# Altium footprint library PERCRO_footprints.PcbLib: 177 footprints (part 8 of 12)
Each footprint in its own frame and in the unit in brackets; x right, y up, seen from the top. Pads: shape width x height; smd on the part's side, far side on the other; paste and mask are expansions set on the pad; w line width, h text height; cw(c..) or ccw(c..) is an arc to the next point about the centre after c.
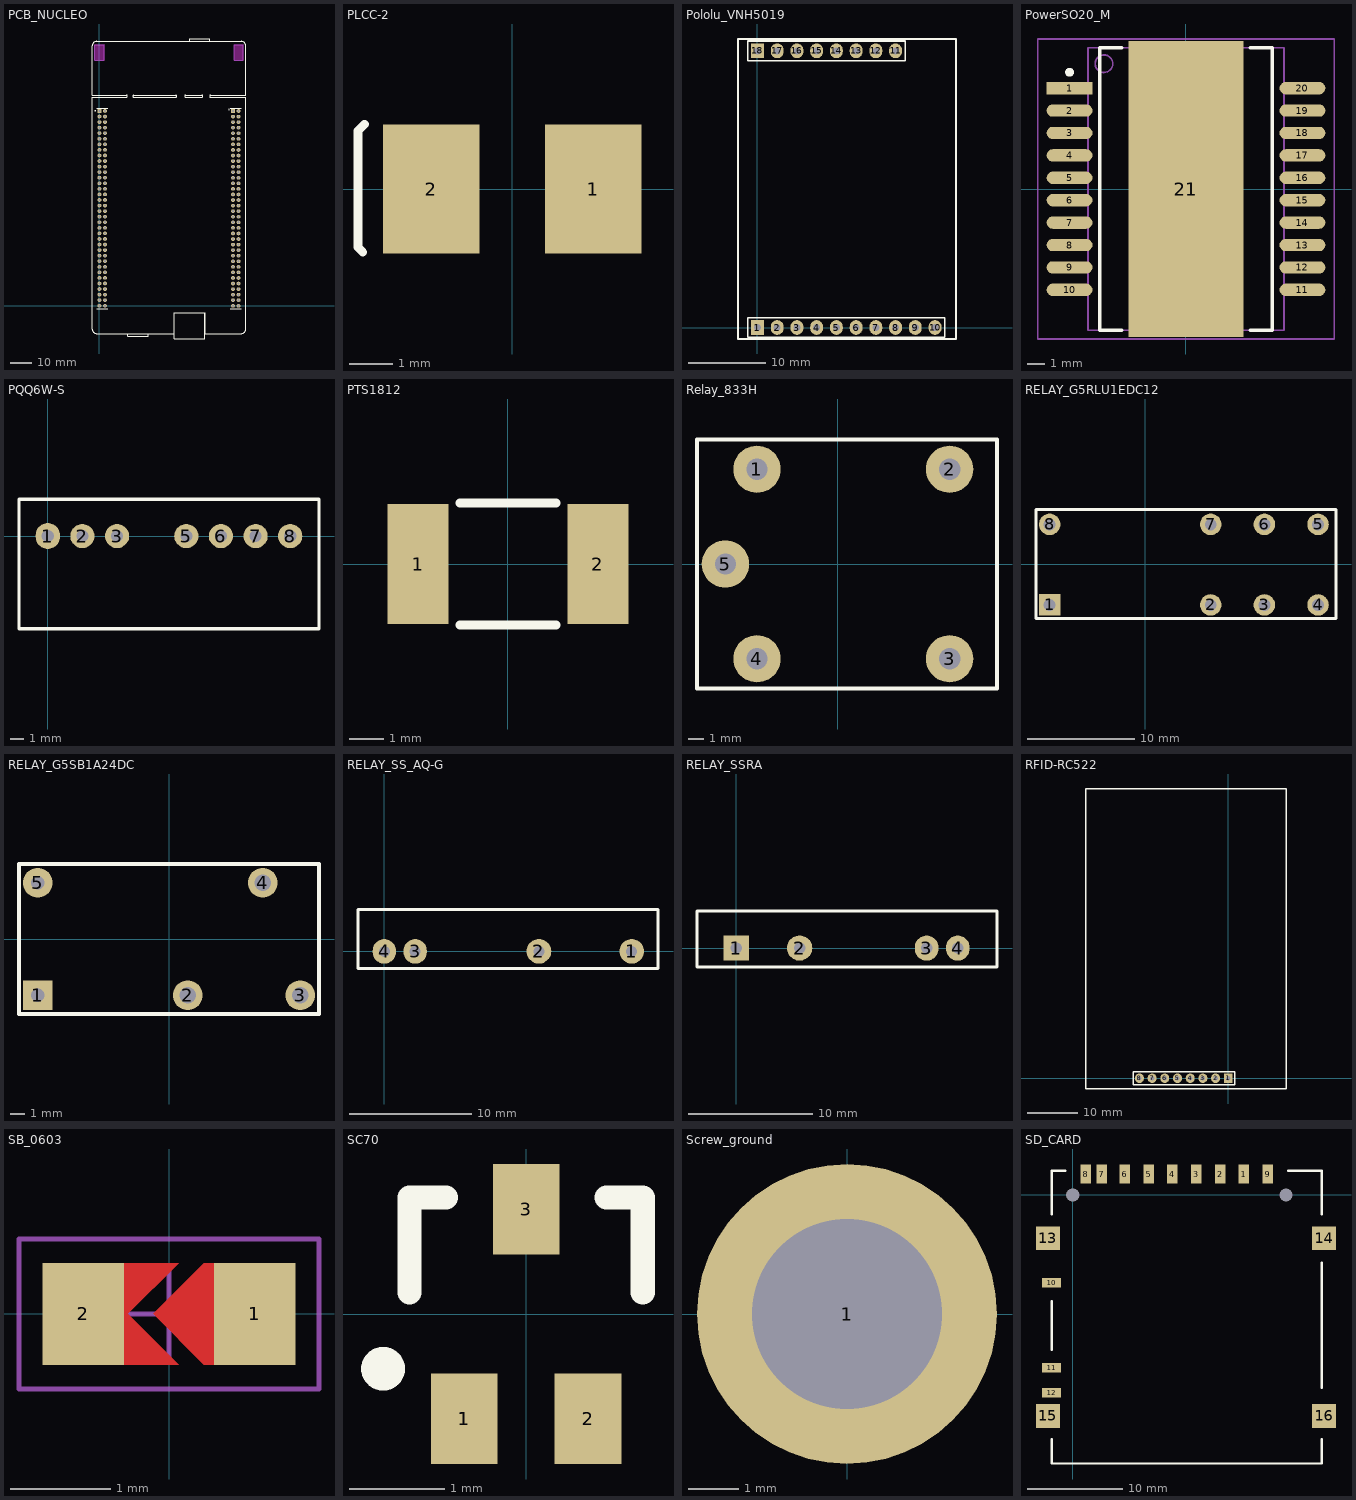
[diagram p7: the footprints below, top view; thin cyan lines are the x and y axes]

## PCB_NUCLEO [mil]
pads (144):
  rect 70x65 hole 40.16: 1(0,3500) 73(2400,3499)
  oval 70x65 hole 40.16: 2(100,3500) 3(0,3400) 4(100,3400) 5(0,3300) 6(100,3300) 7(0,3200) 8(100,3200) 9(0,3100) 10(100,3100) 11(0,3000) 12(100,3000) 13(0,2900) 14(100,2900) 15(0,2800) 16(100,2800) 17(0,2700) 18(100,2700) 19(0,2600) 20(100,2600) 21(0,2500) 22(100,2500) 23(0,2400) 24(100,2400) 25(0,2300) 26(100,2300) 27(0,2200) 28(100,2200) 29(0,2100) 30(100,2100) 31(0,2000) 32(100,2000) 33(0,1900) 34(100,1900) 35(0,1800) 36(100,1800) 37(0,1700) 38(100,1700) 39(0,1600) 40(100,1600) 41(0,1500) 42(100,1500) 43(0,1400) 44(100,1400) 45(0,1300) 46(100,1300) 47(0,1200) 48(100,1200) 49(0,1100) 50(100,1100) 51(0,1000) 52(100,1000) 53(0,900) 54(100,900) 55(0,800) 56(100,800) 57(0,700) 58(100,700) 59(0,600) 60(100,600) 61(0,500) 62(100,500) 63(0,400) 64(100,400) 65(0,300) 66(100,300) 67(0,200) 68(100,200) 69(0,100) 70(100,100) 71(0,0) 72(100,0) 74(2500,3499) 75(2400,3399) 76(2500,3399) 77(2400,3299) 78(2500,3299) 79(2400,3199) 80(2500,3199) 81(2400,3099) 82(2500,3099) 83(2400,2999) 84(2500,2999) 85(2400,2899) 86(2500,2899) 87(2400,2799) 88(2500,2799) 89(2400,2699) 90(2500,2699) 91(2400,2599) 92(2500,2599) 93(2400,2499) 94(2500,2499) 95(2400,2399) 96(2500,2399) 97(2400,2299) 98(2500,2299) 99(2400,2199) 100(2500,2199) 101(2400,2099) 102(2500,2099) 103(2400,1999) 104(2500,1999) 105(2400,1899) 106(2500,1899) 107(2400,1799) 108(2500,1799) 109(2400,1699) 110(2500,1699) 111(2400,1599) 112(2500,1599) 113(2400,1499) 114(2500,1499) 115(2400,1399) 116(2500,1399) 117(2400,1299) 118(2500,1299) 119(2400,1199) 120(2500,1199) 121(2400,1099) 122(2500,1099) 123(2400,999) 124(2500,999) 125(2400,899) 126(2500,899) 127(2400,799) 128(2500,799) 129(2400,699) 130(2500,699) 131(2400,599) 132(2500,599) 133(2400,499) 134(2500,499) 135(2400,399) 136(2500,399) 137(2400,299) 138(2500,299) 139(2400,199) 140(2500,199) 141(2400,99) 142(2500,99) 143(2400,-1) 144(2500,-1)
Top Overlay:
  circle w10: c-75,3502.31 r5
  circle w10: c2328.69,3528 r5
  lines w10: -50,-50 150,-50 ; -50,3550 150,3550 ; -49.37,-500.04 1340,-500.04 1340,-125.16 1898,-125.16 1898,-500.04 2549.06,-500.04 ; -49.21,-500 cw(c-49.21,-421.26) -127.95,-421.26 -127.95,3745.67 482.28,3745.67 ccw(c482.28,3765.35) 482.28,3785.04 -127.95,3785.04 -127.95,4670.87 cw(c-49.21,4670.87) -49.21,4749.61 2549.21,4749.61 cw(c2549.21,4670.87) 2627.95,4670.87 ; 510.9,-499.89 510.9,-544.66 873.1,-544.66 873.1,-499.89 ; 1343.41,-125.16 1343.41,-597.6 1894.59,-597.6 1894.59,-125.16 ; 1618.9,4747.89 1618.9,4792.66 1981.1,4792.66 1981.1,4747.89 ; 2350,-51 2550,-51 ; 2350,3549 2550,3549 ; 2549.06,-499.84 ccw(c2549.06,-421.1) 2627.8,-421.1 ; 2627.95,-421.26 2627.95,3745.67 1998.03,3745.67 cw(c1998.03,3765.35) 1998.03,3785.04 2627.95,3785.04 2627.95,4670.87 ; 2627.95,4670.87 2627.95,4670.87 ; 620.08,3745.67 cw(c620.08,3765.35) 620.08,3785.04 1368.11,3785.04 cw(c1368.11,3765.35) 1368.11,3745.67 620.08,3745.67 ; 1550,3745.67 cw(c1550,3765.35) 1550,3785.04 1838.58,3785.04 cw(c1838.58,3765.35) 1838.58,3745.67 1550,3745.67
Keep-Out Layer:
  board cut-out: -80,4687.6 87.32,4687.6 87.32,4412.4 -80,4412.4
  board cut-out: 2420,4690 2587.32,4690 2587.32,4414.8 2420,4414.8
Mechanical 1:
  lines w20: -80,4412.4 87.32,4412.4 87.32,4687.6 -80,4687.6 -80,4412.4 ; 2420,4412.4 2420,4687.6 2587.32,4687.6 2587.32,4412.4 2420,4412.4
3D body "PCB_NUCLEO.step": height 749.61, standoff -207.09, extent -130.85,-597.64 2630.86,4789.96

## PLCC-2 [mm]
pads (2):
  rect 2.238x3 smd: 1(1.881,0) 2(-1.881,0)
Top Overlay:
  lines w0.2: -3.462,-1.462 -3.574,-1.35 -3.574,1.35 -3.424,1.5
3D body "PLCC-2 package 3D model.STEP": height 1.63, standoff 0, extent -1.743,-1.4 1.757,1.4

## Pololu_VNH5019 [mil]
pads (18):
  rect 65x75 hole 35.43: 1(0,0) 18(0,1402)
  oval 65x75 hole 35.43: 2(100,0) 3(200,0) 4(300,0) 5(400,0) 6(500,0) 7(600,0) 8(700,0) 9(800,0) 10(900,0) 11(700,1402) 12(600,1402) 13(500,1402) 14(400,1402) 15(300,1402) 16(200,1402) 17(100,1402)
Top Overlay:
  lines w7.87: -50,-50 950,-50 950,50 -50,50 -50,-50 ; -50,1352 750,1352 750,1452 -50,1452 -50,1352
  lines w10: -97.36,-58 1005,-58 1005,1462 -97.36,1462 -97.36,-58
3D body "POLOLU_VNH5019.step": height 374.6, standoff -222.83, extent -107.57,-75.2 1015.22,1465.22

## PowerSO20_M [mm] "SOP, 20-Leads, Body 15.9x11mm, Pitch 1.27mm, IPC Low Density"
height 3.6
pads (21):
  rect 2.6x0.7 smd: 1(-6.6,5.715)
  oval 2.6x0.7 smd: 2(-6.6,4.445) 3(-6.6,3.175) 4(-6.6,1.905) 5(-6.6,0.635) 6(-6.6,-0.635) 7(-6.6,-1.905) 8(-6.6,-3.175) 9(-6.6,-4.445) 10(-6.6,-5.715) 11(6.6,-5.715) 12(6.6,-4.445) 13(6.6,-3.175) 14(6.6,-1.905) 15(6.6,-0.635) 16(6.6,0.635) 17(6.6,1.905) 18(6.6,3.175) 19(6.6,4.445) 20(6.6,5.715)
  rect 6.5x16.8 smd: 21(0,0)
Top Overlay:
  circle w0.25: c-6.6,6.615 r0.125
  lines w0.2: -3.65,-8 -4.9,-8 -4.9,8 -3.65,8 ; 3.65,-8 4.9,-8 4.9,8 3.65,8
Mechanical 13:
  circle w0.1: c-4.65,7.1 r0.5
  lines w0.1: -5.55,-8 5.55,-8 5.55,8 -5.55,8 -5.55,-8
Mechanical 15:
  lines w0.1: -0.5,0 0.5,0 ; 0,-0.5 0,0.5 ; -8.4,-8.5 8.4,-8.5 8.4,8.5 -8.4,8.5 -8.4,-8.5
3D body "PowerSO20.STEP": height 3.58, standoff -0.02, extent -7.2,-8 7.2,8

## PQQ6W-S [mil]
pads (7):
  oval 70x75 hole 35: 1(0,0)
  round 70 hole 35: 2(100,0) 3(200,0) 5(400,0) 6(500,0) 7(600,0) 8(700,0)
Top Overlay:
  lines w10: -83.07,-267.72 783.07,-267.72 783.07,106.3 -83.07,106.3 -83.07,-267.72
3D body: height 472.44, standoff 0, extent -83.07,-267.72 783.07,106.3

## PTS1812 [mm]
pads (2):
  rect 1.78x3.5 smd: 1(-2.615,0) 2(2.615,0)
Top Overlay:
  lines w0.254: -1.397,-1.778 1.397,-1.778 ; -1.397,1.778 1.397,1.778

## Relay_833H [mm] "Rele_833H"
pads (5):
  round 3 hole 1.35: 1(-5.1,6) 2(7.1,6) 3(7.1,-6) 4(-5.1,-6) 5(-7.1,0)
Top Overlay:
  lines w0.254: -8.9,-7.874 -8.9,7.874 10.1,7.874 10.1,-7.874 -8.9,-7.874
3D body: height 15, standoff 0, extent -8.91,-7.753 10.089,7.716

## RELAY_G5RLU1EDC12 [mm] "Relay_OMRON"
pads (8):
  rect 2x2 hole 1.105: 1(-8.89,-3.81)
  round 2 hole 1.105: 2(6.11,-3.81) 3(11.11,-3.81) 4(16.11,-3.81) 5(16.11,3.69) 6(11.11,3.69) 7(6.11,3.69) 8(-8.89,3.69)
Top Overlay:
  lines w0.254: -10.16,-5.08 -10.16,5.08 17.78,5.08 17.78,-5.08 -10.16,-5.08
3D body: height 15.5, standoff 0, extent -10.16,-5.08 17.78,5.08

## RELAY_G5SB1A24DC [mm] "Relay_OMRON"
pads (5):
  rect 2x2 hole 0.9: 1(-8.89,-3.81)
  round 2 hole 1.1: 2(1.27,-3.81) 3(8.89,-3.81) 4(6.35,3.81)
  round 2 hole 0.9: 5(-8.89,3.81)
Top Overlay:
  lines w0.254: -10.16,-5.08 10.16,-5.08 10.16,5.08 -10.16,5.08 -10.16,-5.08
3D body: height 15.5, standoff 0, extent -10.16,-5.08 10.16,5.08

## RELAY_SS_AQ-G [mil]
pads (4):
  round 80 hole 35.43: 1(800,0) 2(500,0)
  oval 75x80 hole 35.43: 3(100,0) 4(0,0)
Top Overlay:
  lines w10: -85,-55 885,-55 885,135 -85,135 -85,-55
3D body: height 531.5, standoff 0, extent -80,-55 880,135

## RELAY_SSRA [mm]
pads (4):
  rect 2.032x2.032 hole 0.9: 1(0,0)
  round 2.032 hole 0.9: 2(5.1,0)
  oval 1.905x2.032 hole 0.9: 3(15.3,0) 4(17.8,0)
Top Overlay:
  lines w0.254: -3.15,-1.524 20.95,-1.524 20.95,2.976 -3.15,2.976 -3.15,-1.524
3D body: height 13.7, standoff 0, extent -3.15,-1.524 20.955,2.976

## RFID-RC522 [mil] "RFID reader/writer"
pads (8):
  rect 70x75 hole 35.43: 1(0,0)
  oval 70x75 hole 35.43: 2(-100,0) 3(-200,0) 4(-300,0) 5(-400,0) 6(-500,0) 7(-600,0) 8(-700,0)
Top Overlay:
  lines w10: -1123,-85 457,-85 457,2279 -1123,2279 -1123,-85 ; -750,-50 -750,50 50,50 50,-50 -750,-50
3D body "RFID_V2.STEP": height 259.2, standoff -236.22, extent -1120.4,-88 454.4,2274.2

## SB_0603 [mil] "Jumper"
height 39.37
pads (2):
  rect 32x40 smd: 1(33.75,0) 2(-33.75,0)
Top Layer:
  region: 23.75,20 13.75,20 -6.25,0 13.75,-20 23.75,-20
  region: -26.25,0 -16.25,0 3.75,20 -26.25,20
  region: -26.25,0 -16.25,0 3.75,-20 -26.25,-20
Top Paste:
  region: 23.75,20 13.75,20 -6.25,0 13.75,-20 23.75,-20
  region: -26.25,0 -16.25,0 3.75,20 -26.25,20
  region: -26.25,0 -16.25,0 3.75,-20 -26.25,-20
Top Solder:
  region: 23.75,24 13.75,24 -10.25,0 13.75,-24 23.75,-24
  region: -26.25,0 -12.25,0 11.75,24 -26.25,24
  region: -26.25,0 -12.25,0 11.75,-24 -26.25,-24
Mechanical 15:
  lines w1.97: -18.7,0 18.7,0 ; 0,-18.7 0,18.7 ; -59.06,-29.53 -59.06,29.53 59.06,29.53 59.06,-29.53 -59.06,-29.53

## SC70 [mm]
pads (4):
  rect 0.7x0.95 smd: 1(-0.65,-1.1) 1(-0.65,-1.1) 2(0.65,-1.1) 3(0,1.1)
Top Overlay:
  circle w0.254: c-1.503,-0.575 r0.103
  lines w0.254: -1.224,0.225 -1.224,1.225 -0.843,1.225 ; 0.843,1.225 1.224,1.225 1.224,0.225

## Screw_ground [mm]
pads (1):
  round 6 hole 3.8: 1(0,0)

## SD_CARD [mm] "SMD_SD_CARD"
pads (18):
  round 0 hole 1.4: 0(0,0) 0(22.4,0)
  rect 1.1x2 smd: 1(17.975,2.2) 2(15.475,2.2) 3(12.975,2.2) 4(10.475,2.2) 5(7.975,2.2) 6(5.475,2.2) 7(3.05,2.2) 8(1.35,2.2) 9(20.475,2.2)
  rect 2x1 smd: 10(-2.2,-9.2) 11(-2.2,-18.15) 12(-2.2,-20.75)
  rect 2.5x2.5 smd: 13(-2.6,-4.55) 14(26.4,-4.55) 15(-2.6,-23.2) 16(26.4,-23.2)
Top Overlay:
  lines w0.254: -2.2,-25.654 -2.2,-28.194 26.162,-28.194 26.162,-25.654 ; -2.2,-16.256 -2.2,-11.176 ; -2.2,-2.032 -2.2,2.54 -0.762,2.54 ; 22.606,2.54 26.162,2.54 26.162,-2.032 ; 26.162,-20.256 26.162,-7.112
3D body "SD_CARD.stp": height 2.95, standoff -0.5, extent -3.1,-28 26.9,2.5